# Altium footprint library Components.PcbLib: 139 footprints (part 3 of 9)
Each footprint in its own frame and in the unit in brackets; x right, y up, seen from the top. Pads: shape width x height; smd on the part's side, far side on the other; paste and mask are expansions set on the pad; w line width, h text height; cw(c..) or ccw(c..) is an arc to the next point about the centre after c.
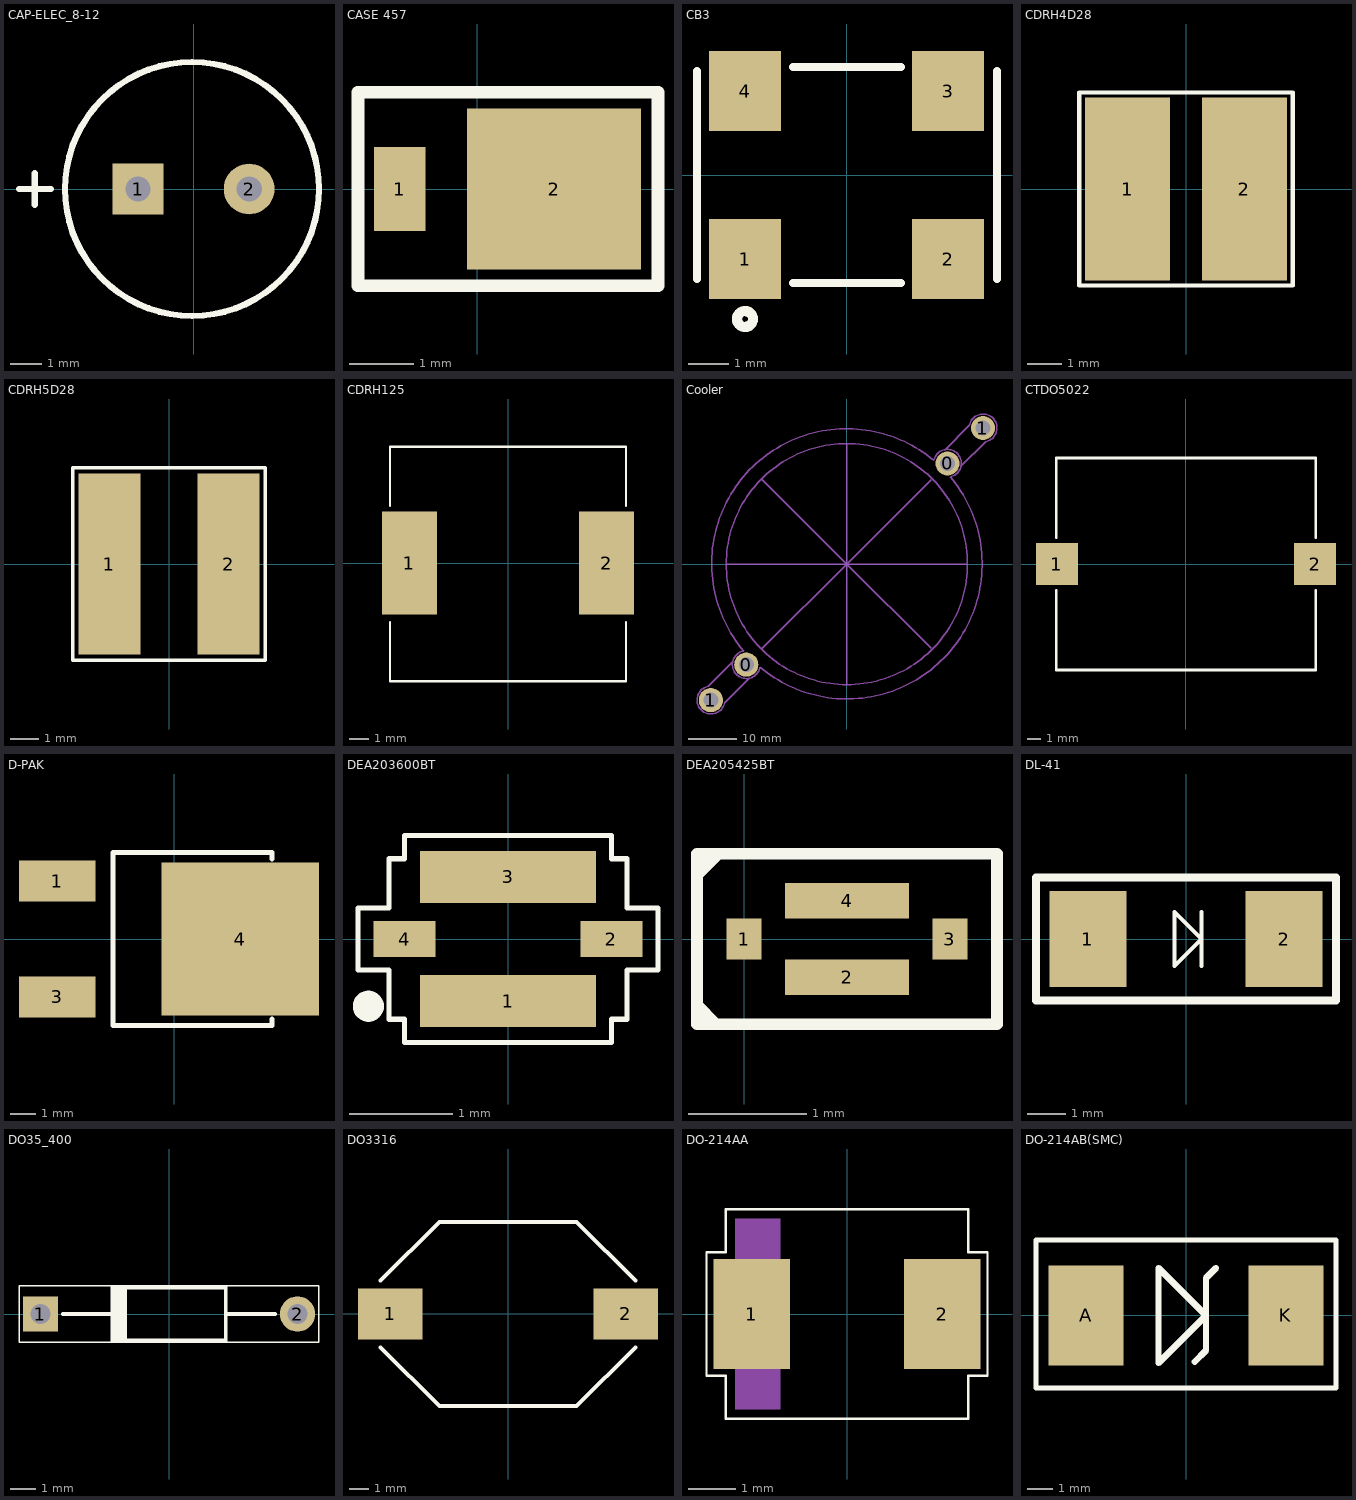
[diagram p2: the footprints below, top view; thin cyan lines are the x and y axes]

## CAP-ELEC_8-12 [mm]
pads (2):
  rect 1.6x1.6 / inner round 1.6 / far side rect 1.6x1.6 hole 0.8 mask+0.05: 1(-1.75,0)
  round 1.6 hole 0.8 mask+0.05: 2(1.75,0)
Top Overlay:
  circle w0.2: c-0.05,0 r4
  lines w0.2: -5.5,0 -4.5,0 ; -5,-0.5 -5,0.5
3D body "ELECTROLITIC CAPACITOR 8X12.STEP": height 12, standoff -2.5, extent -4,-4 4,4

## CASE 457 [mm]
height 2.38
pads (2):
  rect 0.8x1.3 smd paste-0.08 mask+0.08: 1(-1.195,0)
  rect 2.7x2.5 smd paste-0.25 mask+0.1: 2(1.195,0)
Top Overlay:
  lines w0.2: -1.845,-1.5 2.805,-1.5 2.805,1.5 -1.845,1.5 -1.845,-1.5
3D body "Case 457.STEP": height 1.18, standoff 0.02, extent -1.445,-1.025 2.455,1.025

## CB3 [mm]
pads (4):
  rect 1.8x2 smd paste-0.21: 1(-2.54,-2.1) 2(2.54,-2.1) 3(2.54,2.1) 4(-2.54,2.1)
Top Overlay:
  circle w0.254: c-2.54,-3.6 r0.2
  lines w0.2: -3.74,-2.6 -3.74,2.6 ; -1.34,-2.7 1.36,-2.7 ; -1.34,2.7 1.36,2.7 ; 3.76,-2.6 3.76,2.6
3D body: height 1.7, standoff 0, extent -3.639,-2.599 3.659,2.599

## CDRH4D28 [mm] "Precision Wire Wound Inductor, 2-Leads, Body 4,7x4,7mm, IPC Medium Density"
height 3
pads (2):
  rect 2.5x5.4 smd paste-0.3 mask+0.1: 1(-1.725,0) 2(1.725,0)
Top Overlay:
  lines w0.12: -3.15,-2.85 -3.15,2.85 3.15,2.85 3.15,-2.85 -3.15,-2.85
3D body "User Library-CDRH4D28.STEP": height 2.91, standoff 0, extent -2.45,-2.4 2.45,2.5

## CDRH5D28 [mm] "Precision Wire Wound Inductor, 2-Leads, Body 4,7x4,7mm, IPC Medium Density"
height 3
pads (2):
  rect 2.15x6.3 smd paste-0.2 mask+0.1: 1(-2.075,0) 2(2.075,0)
Top Overlay:
  lines w0.12: -3.35,-3.35 3.35,-3.35 3.35,3.35 -3.35,3.35 -3.35,-3.35
3D body "CDRH5D28.STEP": height 2.73, standoff -0.03, extent -3.07,-3 3,3

## CDRH125 [mm]
pads (2):
  rect 2.9x5.4 smd paste-0.25 mask+0.1: 1(-5.175,0) 2(5.175,0)
Top Overlay:
  lines w0.12: -6.2,-3.1 -6.2,-6.2 6.2,-6.2 6.2,-3.1 ; -6.2,3 -6.2,6.1 6.2,6.1 6.2,3
3D body "CDRH124.STEP": height 4.5, standoff -0.05, extent -6.15,-6.2 6.15,6.1

## Cooler [mm]
pads (4):
  round 5 hole 3.1: 0(-20.86,-20.86) 0(20.86,20.86) 1(-28.214,-28.214) 1(28.214,28.214)
Mechanical 13:
  circle w0.3: c0,0 r25
  lines w0.3: -25.375,-28.75 -20.375,-23.75 ; -25.363,-28.752 cw(c-28.192,-28.202) -28.75,-25.375 -23.75,-20.375 ; -25,0 0,0 ; -21.418,-18.032 ccw(c-20.86,-20.86) -18.02,-21.35 ; -21.408,-18.029 cw(c-0.049,0.076) 17.991,21.49 ; -18,-21.375 ccw(c0.04,0.039) 21.46,18.072 ; -17.5,-17.5 0,0 ; -17.5,17.5 0,0 ; 0,-25 0,0 ; 0,25 0,0 ; 17.5,-17.5 0,0 ; 17.5,17.5 0,0 ; 18.021,21.483 cw(c20.84,20.885) 21.51,18.082 ; 20.375,23.75 25.375,28.75 ; 23.625,20.25 28.75,25.375 ; 25,0 0,0 ; 25.395,28.725 cw(c28.235,28.235) 28.793,25.407

## CTDO5022 [mm] "Precision Wire Wound Inductor, 2-Leads, Body 18,6x15,2mm, IPC Medium Density"
height 7.11
pads (2):
  rect 3x3 smd paste-0.4: 1(-9.25,0) 2(9.25,0)
Top Overlay:
  lines w0.2: -9.3,-1.9 -9.3,-7.6 9.3,-7.6 9.3,-1.9 ; -9.3,1.9 -9.3,7.6 9.3,7.6 9.3,1.9
3D body: height 7.11, standoff 0, extent -9.27,-7.62 9.27,7.62

## D-PAK [mm] "D-PAK, 3-Pads, Body 6,3x6,8mm (max), IPC Medium Density"
height 2.38
pads (3):
  rect 3x1.6 smd paste-0.2: 1(-4.6,2.28) 3(-4.6,-2.28)
  rect 6.2x6 smd paste-0.9: 4(2.6,0)
Top Overlay:
  lines w0.2: 3.85,-3.14 3.85,-3.4 -2.4,-3.4 -2.4,3.4 3.85,3.4 3.85,3.14
3D body "User Library-DPAK-1.step": height 2.39, standoff -0.02, extent -5.018,-3.23 4.92,3.31

## DEA203600BT [mm]
pads (4):
  rect 1.7x0.5 smd paste-0.05 mask+0.05: 1(0,-0.6) 3(0,0.6)
  rect 0.6x0.35 smd paste-0.05 mask+0.05: 2(1,0) 4(-1,0)
Top Overlay:
  circle w0.2: c-1.35,-0.65 r0.05
  lines w0.05: -1.45,-0.3 -1.45,0.3 -1.15,0.3 -1.15,0.775 -1,0.775 -1,1 1,1 1,0.775 1.15,0.775 1.15,0.3 1.45,0.3 1.45,-0.3 1.15,-0.3 1.15,-0.775 1,-0.775 1,-1 -1,-1 -1,-0.775 -1.15,-0.775 -1.15,-0.3 -1.45,-0.3

## DEA205425BT [mm]
pads (4):
  rect 0.3x0.35 smd paste-0.05 mask+0.03: 1(0,0) 3(1.75,0)
  rect 1.05x0.3 smd paste-0.04 mask+0.03: 2(0.875,-0.325) 4(0.875,0.325)
Top Overlay:
  region: -0.4,0.496 -0.379,0.496 -0.15,0.725 -0.4,0.725
  region: -0.4,-0.497 -0.172,-0.725 -0.4,-0.725
  lines w0.1: -0.4,-0.725 -0.4,0.725 2.15,0.725 2.15,-0.725 -0.4,-0.725

## DL-41 [mm]
pads (2):
  rect 2x2.5 smd paste-0.1: 1(-2.55,0) 2(2.55,0)
Top Overlay:
  lines w0.1: 0.4,-0.7 0.4,0.7 ; 0.4,0 0.4,0 ; 0.4,0 -0.3,0.7 -0.3,-0.7 0.4,0 ; 0.4,0 0.4,0
  lines w0.2: -3.9,-1.6 3.9,-1.6 3.9,1.6 -3.9,1.6 -3.9,-1.6
3D body "User Library-DL-41.step": height 2.4, standoff 0, extent -2.5,-1.2 2.5,1.2

## DO35_400 [mm]
pads (2):
  rect 1.4x1.4 / inner round 1.4 / far side rect 1.4x1.4 hole 0.8 mask+0.05: 1(-5.1,0)
  round 1.4 hole 0.8 mask+0.05: 2(5.1,0)
Top Overlay:
  lines w0.05: -5.95,-1.125 5.95,-1.125 5.95,1.125 -5.95,1.125 -5.95,-1.125
  lines w0.15: -4.2,0 -2.25,0 ; -2.1,-1.05 -2.1,1.05 ; -2,-1.05 -2,1.05 ; -1.875,-1.05 -1.875,1.05 ; -1.75,-1.05 -1.75,1.05 ; 2.25,0 4.2,0 ; -2.25,-1.05 -2.25,1.05 2.25,1.05 2.25,-1.05 -2.25,-1.05
3D body "User Library-do_35.step": height 3.15, standoff -1.54, extent -5.396,-0.9 5.296,0.853

## DO3316 [mm] "Precision Wire Wound Inductor, 2-Leads, Body 12,9x9,4mm, IPC Medium Density"
height 5.21
pads (2):
  rect 3.3x2.6 smd paste-0.2: 1(-6,0) 2(6,0)
Top Overlay:
  lines w0.2: -6.5,-1.7 -3.5,-4.7 3.5,-4.7 6.5,-1.7 ; -6.5,1.7 -3.5,4.7 3.5,4.7 6.5,1.7
3D body "Coilcraft-DO3316P.step": height 5.16, standoff -0.05, extent -6.137,-4.7 6.237,4.7

## DO-214AA [mm]
pads (2):
  rect 1.6x2.3 smd paste-0.18 mask+0.05: 1(-2,0) 2(2,0)
Top Overlay:
  lines w0.05: -2.95,-1.3 -2.95,1.3 -2.55,1.3 -2.55,2.2 2.55,2.2 2.55,1.3 2.95,1.3 2.95,-1.3 2.55,-1.3 2.55,-2.2 -2.55,-2.2 -2.55,-1.3 -2.95,-1.3
Mechanical 1:
  region: -2.35,2 -1.4,2 -1.4,-2 -2.35,-2
3D body "SW3dPS-DO-214AA SMB.STEP": height 2.3, standoff 0, extent -2.7,-1.8 2.7,1.8

## DO-214AB(SMC) [mm]
pads (2):
  rect 3x4 smd paste-0.2: A(-4,0) K(4,0)
Top Overlay:
  lines w0.2: -6,-2.9 -6,0 -6,3.02 6,3.02 6,-2.9 -6,-2.9
  lines w0.254: 0.35,-1.85 0.8,-1.4 0.8,0 ; 1.2,1.9 0.8,1.5 0.8,0 ; 0.8,0 -1.1,1.9 -1.1,-1.9 0.8,0
3D body "User Library-DO-214AB SMC.step": height 2.25, standoff -0.05, extent -3.815,-2.9 4.135,3